# Altium footprint library MODULE.PcbLib: 33 footprints (part 1 of 3)
Each footprint in its own frame and in the unit in brackets; x right, y up, seen from the top. Pads: shape width x height; smd on the part's side, far side on the other; paste and mask are expansions set on the pad; w line width, h text height; cw(c..) or ccw(c..) is an arc to the next point about the centre after c.
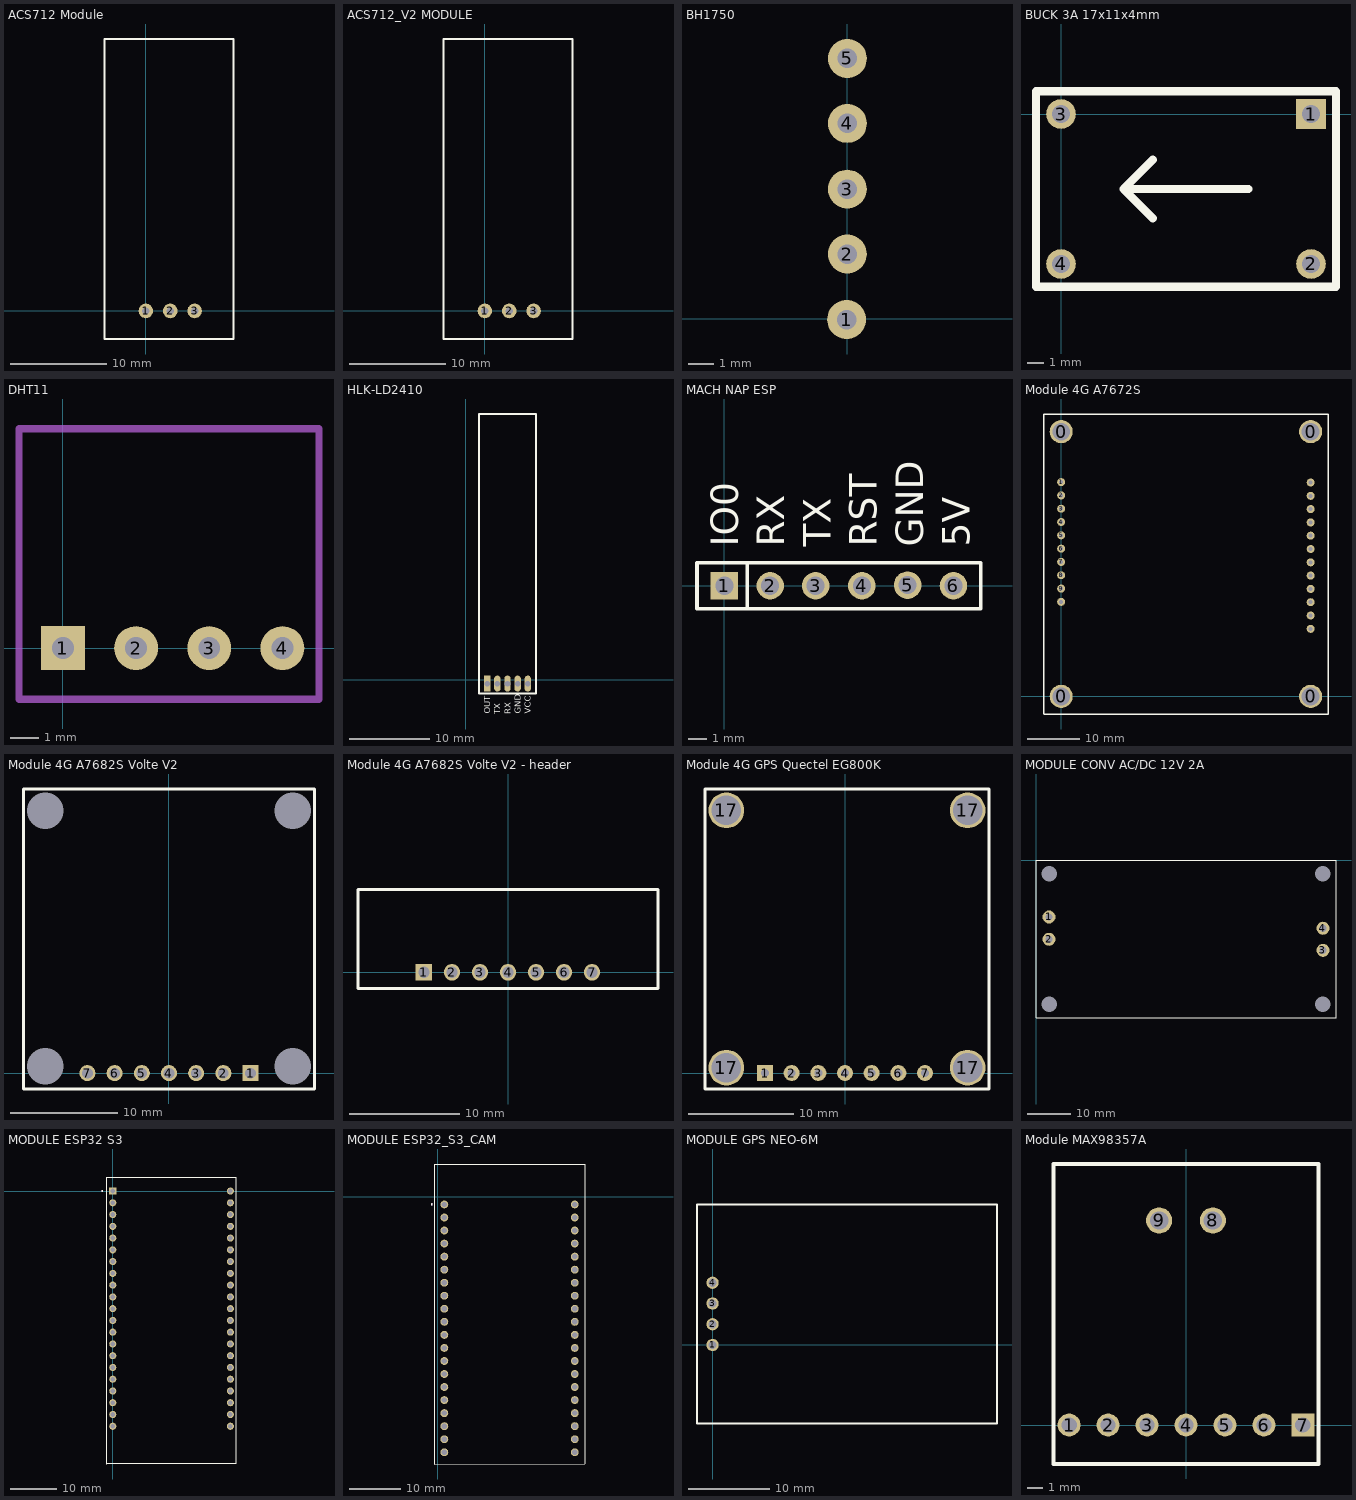
[diagram p0: the footprints below, top view; thin cyan lines are the x and y axes]

## ACS712 Module [mil]
pads (3):
  round 60 hole 30: 1(0,0) 2(100,0) 3(200,0)
Top Overlay:
  lines w7.87: -170,-115 360,-115 360,1115 -170,1115 -170,-115
3D body "acs712.STEP": height 531.89, standoff -55.04, extent -166.81,-114.17 356.81,1114.17

## ACS712_V2 MODULE [mil]
pads (3):
  round 60 hole 30: 1(0,0) 2(100,0) 3(200,0)
Top Overlay:
  lines w7.87: -170,-115 -170,1115 360,1115 360,-115 -170,-115
3D body "pin header female 2.54mm_0.1in.STEP": height 346.46, standoff -348.03, extent -50,-50 250,50

## BH1750 [mil] "GY-302 BH1750, 3V3 - 5V, Light sensor"
pads (5):
  round 60 hole 30: 1(-0.97,-0.85) 2(0,100) 3(0,200) 4(0.12,301.1) 5(0.12,401.1)
3D body "1x5.STEP": height 354.33, standoff -340.16, extent -50,-50 50,450
3D body "BH1750_with_connector.STEP": height 586.87, standoff 127.31, extent -55,-79.82 683.8,475

## BUCK 3A 17x11x4mm [mm] "DSN-MINI-360"
pads (4):
  rect 1.8x1.8 hole 1.1: 1(15.24,0)
  round 1.8 hole 1.1: 2(15.24,-9.144) 3(0,0) 4(0,-9.144)
Top Overlay:
  lines w0.508: 5.588,-6.35 3.81,-4.572 ; 5.588,-2.794 3.81,-4.572 ; 11.43,-4.572 3.81,-4.572 ; -1.524,-10.541 16.764,-10.541 16.764,1.397 -1.524,1.397 -1.524,-10.541
3D body "DSN Mini-360 Buck Converter.step": height 7.24, standoff -4.79, extent -1.38,-10.397 16.62,1.253

## DHT11 [mil] "Mdule DHT11"
pads (4):
  rect 60x60 hole 30: 1(0,0)
  round 60 hole 30: 2(100,0) 3(200,0) 4(300,0)
Mechanical 1:
  lines w10: -60,-70 -60,300 350,300 350,-70 -60,-70
3D body "KY-015.step": height 214.97, standoff -119.68, extent -220,-295.17 409.92,795.17

## HLK-LD2410 [mm]
pads (5):
  rect 0.8x2 hole 0.7: 1(2.667,-0.508)
  oval 0.8x2 hole 0.7: 2(3.937,-0.508) 3(5.207,-0.508) 4(6.477,-0.508) 5(7.747,-0.508)
Top Overlay:
  lines w0.254: 1.651,-1.778 1.651,33.274 8.763,33.274 8.763,-1.778 1.651,-1.778
  text "OUT" at 3.048,-4.318 h0.76
  text "TX" at 4.318,-4.318 h0.76
  text "RX" at 5.588,-4.318 h0.76
  text "GND" at 6.858,-4.318 h0.76
  text "VCC" at 8.128,-4.318 h0.76
3D body "HLK-2410B.step": height 2.1, standoff -0.05, extent 1.707,-1.778 8.707,33.222

## MACH NAP ESP [mil]
pads (6):
  rect 60x60 hole 39.37: 1(0,0)
  round 60 hole 39.37: 2(100,0) 3(199.21,0) 4(300,0) 5(400,1.33) 6(500,0)
Top Overlay:
  lines w7.87: 50,-50 50,50 ; -59.84,-50 -59.84,50 559.85,50 559.85,-50 -59.84,-50
  text "IO0" at 30,85 h60
  text "RX" at 131,85 h60
  text "TX" at 232,85 h60
  text "RST" at 333,85 h60
  text "GND" at 434,85 h60
  text "5V" at 535,85 h60
3D body "61300611821.stp": height 335.04, standoff -121.65, extent -59.84,-49.21 559.85,49.22

## Module 4G A7672S [mil]
pads (26):
  round 173.23 hole 133.86: 0(0,0) 0(0,1990) 0(1875,0) 0(1875,1990)
  round 60 hole 30: 1(0,1610.63) 2(0,1510.63) 3(0,1410.63) 4(0,1310.63) 5(0,1210.63) 6(0,1110.63) 7(0,1010.63) 8(0,910.63) 9(0,810.63) 10(0,710.63) 11(1875,507.87) 12(1875,607.87) 13(1875,707.87) 14(1875,807.87) 15(1875,907.87) 16(1875,1007.87) 17(1875,1107.87) 18(1875,1207.87) 19(1875,1307.87) 20(1875,1407.87) 21(1875,1507.87) 22(1875,1607.87)
Top Overlay:
  lines w10: -132.4,-130.43 -132.4,2122.72 2006.33,2122.72 ; -130.43,-132.4 2008.54,-132.4 2008.54,2120.75

## Module 4G A7682S Volte V2 [mm] "TDM2431"
pads (11):
  oval 3x0 hole 3.4 unplated: 0(-11.557,0.635) 0(-11.557,24.511) 0(11.557,0.635) 0(11.557,24.511)
  rect 1.5x1.5 hole 1: 1(7.62,0)
  round 1.5 hole 1: 2(5.08,0) 3(2.54,0) 4(0,0) 5(-2.54,0) 6(-5.08,0) 7(-7.62,0)
Top Overlay:
  lines w0.254: -13.6,-1.485 -13.6,26.543 13.6,26.543 13.6,-1.485 -13.6,-1.485

## Module 4G A7682S Volte V2 - header [mm] "TDM2431"
pads (8):
  rect 1.5x1.5 hole 1: 1(-7.62,0)
  round 1.5 hole 1: 2(-5.08,0) 3(-2.54,0) 4(0,0) 5(2.54,0) 6(5.08,0) 7(7.62,0) ""(-7.62,0)
Top Overlay:
  lines w0.254: 13.6,7.493 -13.6,7.493 -13.6,-1.485 13.6,-1.485 13.6,7.515

## Module 4G GPS Quectel EG800K [mil] "Module 4G GPS Quectel EG800K"
pads (11):
  rect 60x60 hole 30: 1(-300,0)
  round 60 hole 30: 2(-200,0) 3(-100,0) 4(0,0) 5(100,0) 6(200,0) 7(300,0)
  round 133.86 hole 110.24: 17(-445,20) 17(-445,985) 17(460,20) 17(460,985)
Top Overlay:
  lines w10: -525,-60 540,-60 540,1065 -525,1065 -525,-60
3D body "TDM2404-4G-GPS.step": height 136.02, standoff -64.96, extent -525,-60.04 536.02,1060.04

## MODULE CONV AC/DC 12V 2A [mm] "IN: AC 85 ~ 265v 50 / 60HZ / OUT: DC12V ( ± 0,2V )"
pads (8):
  round 3 hole 1.7: 1(3,-13.03) 2(3,-18.161) 3(66.101,-20.702) 4(66.101,-15.622)
  round 0 hole 3.6: 1(3.09,-33.15) 1(3.09,-3.051) ""(66.046,-33.15) ""(66.046,-3.051)
Top Overlay:
  lines w0.2: 0,0 0,-36.208 69.101,-36.208 69.101,0 ; 0,0.013 69.101,0.013 ; 3.429,-36.195 3.683,-36.195

## MODULE ESP32 S3 [mm] "N16P8-Type_C"
pads (42):
  rect 1.53x1.53 / inner round 1.53 / far side rect 1.53x1.53 hole 1.02: J1_1(0,0)
  round 1.53 hole 1.02: J1_2(0,-2.54) J1_3(0,-5.08) J1_4(0,-7.62) J1_5(0,-10.16) J1_6(0,-12.7) J1_7(0,-15.24) J1_8(0,-17.78) J1_9(0,-20.32) J1_10(0,-22.86) J1_11(0,-25.4) J1_12(0,-27.94) J1_13(0,-30.48) J1_14(0,-33.02) J1_15(0,-35.56) J1_16(0,-38.1) J1_17(0,-40.64) J1_18(0,-43.18) J1_19(0,-45.72) J1_20(0,-48.26) J1_21(0,-50.8) J3_1(25.4,0) J3_2(25.4,-2.54) J3_3(25.4,-5.08) J3_4(25.4,-7.62) J3_5(25.4,-10.16) J3_6(25.4,-12.7) J3_7(25.4,-15.24) J3_8(25.4,-17.78) J3_9(25.4,-20.32) J3_10(25.4,-22.86) J3_11(25.4,-25.4) J3_12(25.4,-27.94) J3_13(25.4,-30.48) J3_14(25.4,-33.02) J3_15(25.4,-35.56) J3_16(25.4,-38.1) J3_17(25.4,-40.64) J3_18(25.4,-43.18) J3_19(25.4,-45.72) J3_20(25.4,-48.26) J3_21(25.4,-50.8)
Top Overlay:
  circle w0.2: c-2.286,0.002 r0.1
  lines w0.127: -1.27,-58.952 -1.27,3 26.67,3 26.67,2.921 26.67,-58.801 -1.27,-58.801
Mechanical 13:
  circle w0.2: c-2.286,0.002 r0.1
3D body "10-Pin Header - Female - 2.54mm.step": height 5, standoff -3, extent -1.25,-24.38 1.25,1.52
3D body "11-Pin Header - Female - 2.54mm.step": height 5, standoff -3, extent -1.25,-52.32 1.25,-23.88
3D body "10-Pin Header - Female - 2.54mm.step": height 5, standoff -3, extent 24.15,-24.38 26.65,1.52
3D body "11-Pin Header - Female - 2.54mm.step": height 5, standoff -3, extent 24.15,-52.32 26.65,-23.88

## MODULE ESP32_S3_CAM [mm]
pads (40):
  round 1.53 hole 1.02: J1_2(1.27,-1.524) J1_3(1.27,-4.064) J1_4(1.27,-6.604) J1_5(1.27,-9.144) J1_6(1.27,-11.684) J1_7(1.27,-14.224) J1_8(1.27,-16.764) J1_9(1.27,-19.304) J1_10(1.27,-21.844) J1_11(1.27,-24.384) J1_12(1.27,-26.924) J1_13(1.27,-29.464) J1_14(1.27,-32.004) J1_15(1.27,-34.544) J1_16(1.27,-37.084) J1_17(1.27,-39.624) J1_18(1.27,-42.164) J1_19(1.27,-44.704) J1_20(1.27,-47.244) J1_21(1.27,-49.784) J3_2(26.67,-1.524) J3_3(26.67,-4.064) J3_4(26.67,-6.604) J3_5(26.67,-9.144) J3_6(26.67,-11.684) J3_7(26.67,-14.224) J3_8(26.67,-16.764) J3_9(26.67,-19.304) J3_10(26.67,-21.844) J3_11(26.67,-24.384) J3_12(26.67,-26.924) J3_13(26.67,-29.464) J3_14(26.67,-32.004) J3_15(26.67,-34.544) J3_16(26.67,-37.084) J3_17(26.67,-39.624) J3_18(26.67,-42.164) J3_19(26.67,-44.704) J3_20(26.67,-47.244) J3_21(26.67,-49.784)
Top Overlay:
  circle w0.2: c-1.143,-1.524 r0.1
  lines w0.127: -0.635,-52.07 -0.635,6.35 28.575,6.35 28.575,-52.07 -0.635,-52.07
Mechanical 13:
  circle w0.2: c-1.143,-1.524 r0.1
3D body "Freenove ESP32-S3-WROOM-CAM.step": height 6.96, standoff -10.51, extent -0.13,-51.363 28.07,5.855

## MODULE GPS NEO-6M [mm] "23x30mm, Baud: 9600"
pads (4):
  round 1.5 hole 1: 1(0,0) 2(0,2.54) 3(0,5.08) 4(0,7.62)
Top Overlay:
  lines w0.2: -1.905,-9.608 34.798,-9.608 ; -1.905,-9.525 -1.905,17.189 34.798,17.189 34.798,-9.525
3D body "neo6mGps.SLDPRT": height 6, standoff -10, extent -1.524,-9.19 34.476,16.81

## Module MAX98357A [mm]
pads (9):
  round 1.5 hole 1: 1(-7.62,0) 2(-5.08,0) 3(-2.54,0) 4(0,0) 5(2.54,0) 6(5.08,0)
  rect 1.5x1.5 hole 1: 7(7.62,0)
  round 1.7 hole 1.2: 8(1.75,13.335) 9(-1.75,13.335)
Top Overlay:
  lines w0.254: -8.636,-2.54 8.636,-2.54 8.636,17.018 -8.636,17.018 -8.636,-2.54
3D body "MAX98357A_3W_I2S_AMP v27.step": height 12.86, standoff -5.17, extent -9,-2.388 9,17.012